# Altium footprint library AltiumLibraries.PcbLib: 247 footprints (part 8 of 16)
Each footprint in its own frame and in the unit in brackets; x right, y up, seen from the top. Pads: shape width x height; smd on the part's side, far side on the other; paste and mask are expansions set on the pad; w line width, h text height; cw(c..) or ccw(c..) is an arc to the next point about the centre after c.
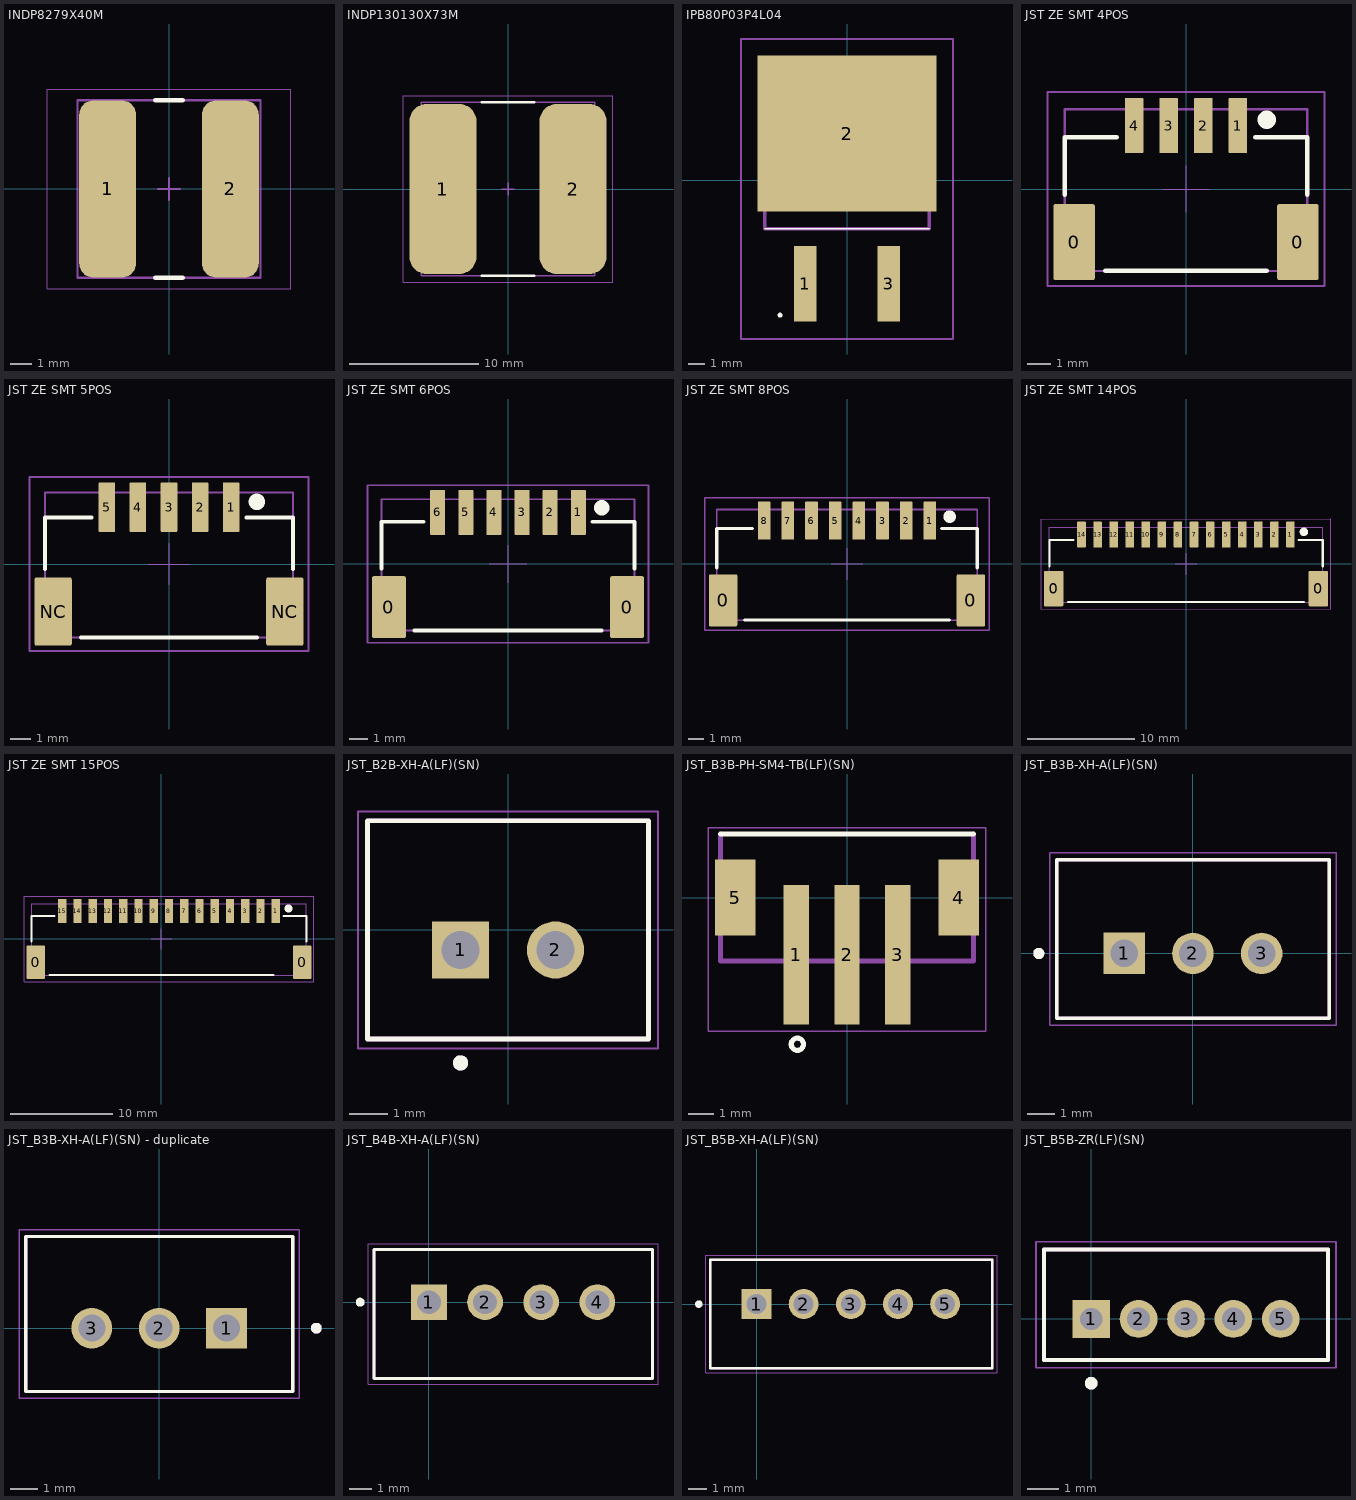
[diagram p7: the footprints below, top view; thin cyan lines are the x and y axes]

## INDP8279X40M [mm] "Precision Wire Wound Inductor, 2-Leads, Body 8.15x7.90mm, IPC Low Density"
height 4
pads (2):
  rrect50% 2.6x8.1 smd: 1(-2.8,0) 2(2.8,0)
Top Overlay:
  lines w0.2: -0.625,-4.05 0.625,-4.05 ; -0.625,4.05 0.625,4.05
Mechanical 13:
  lines w0.1: -4.175,-4.05 4.175,-4.05 4.175,4.05 -4.175,4.05 -4.175,-4.05
Mechanical 15:
  lines w0.05: -5.55,-4.55 5.55,-4.55 5.55,4.55 -5.55,4.55 -5.55,-4.55
  lines w0.1: -0.5,0 0.5,0 ; 0,-0.5 0,0.5
3D body "Inductor SRN8040.step": height 4, standoff 0, extent -4.009,-4 4.009,4

## INDP130130X73M [mm] "Precision Wire Wound Inductor, 2-Leads, Body 13.00x13.00mm, IPC Low Density"
height 7.3
pads (2):
  rrect50% 5.2x13.2 smd: 1(-5.05,0) 2(5.05,0)
Top Overlay:
  lines w0.2: -2.05,-6.75 2.05,-6.75 ; -2.05,6.75 2.05,6.75
Mechanical 13:
  lines w0.1: -6.75,-6.75 6.75,-6.75 6.75,6.75 -6.75,6.75 -6.75,-6.75
Mechanical 15:
  lines w0.05: -8.125,-7.25 8.125,-7.25 8.125,7.25 -8.125,7.25 -8.125,-7.25
  lines w0.1: -0.5,0 0.5,0 ; 0,-0.5 0,0.5
3D body "sdr1307-180ml.stp": height 7, standoff 0, extent -6.5,-6.5 6.5,6.5

## IPB80P03P4L04 [mm]
pads (3):
  rect 1.35x4.6 smd: 1(-2.54,-6.3) 3(2.54,-6.3)
  rect 10.9x9.5 smd: 2(0,2.85)
Top Overlay:
  lines w0.1: -5,-2.95 5,-2.95 -5,-2.95
  lines w0.2: -4.124,-8.198 ccw(c-4.074,-8.198) -4.024,-8.198 ccw(c-4.074,-8.198) -4.124,-8.198
Mechanical 13:
  lines w0.2: -5,-2.95 -5,6.3 5,6.3 5,-2.95 -5,-2.95
Mechanical 15:
  lines w0.1: -6.45,-9.652 -6.45,8.6 6.45,8.6 6.45,-9.652 -6.45,-9.652
3D body "TO263-2-1.stp": height 4.22, standoff 0, extent -4.911,-7.72 4.911,6.866

## JST ZE SMT 4POS [mm] "4 POS HDR JST ZE"
pads (6):
  rrect10% 1.8x3.3 smd: 0(-4.85,-2.3) 0(4.85,-2.3)
  rrect10% 0.8x2.4 smd: 1(2.25,2.75) 2(0.75,2.75) 3(-0.75,2.75) 4(-2.25,2.75)
Top Overlay:
  circle w0.8: c3.5,3 r0
  lines w0.2: -5.25,-0.25 -5.25,2.25 -3,2.25 ; -3.5,-3.55 3.5,-3.55 ; 3,2.25 5.25,2.25 5.25,-0.25
Mechanical 13:
  lines w0.1: -5.25,-3.55 -5.25,3.45 5.25,3.45 5.25,-3.55 -5.25,-3.55
Mechanical 15:
  lines w0.05: 0,-1 0,0 ; 0,1 0,0 ; 1,0 0,0 ; 0,0 -1,0 0,0
  lines w0.1: -6,-4.2 -6,4.2 6,4.2 6,-4.2 -6,-4.2

## JST ZE SMT 5POS [mm] "5 POS HDR JST ZE"
pads (7):
  rrect10% 0.8x2.4 smd: 1(3,2.75) 2(1.5,2.75) 3(0,2.75) 4(-1.5,2.75) 5(-3,2.75)
  rrect10% 1.8x3.3 smd: NC(-5.6,-2.3) NC(5.6,-2.3)
Top Overlay:
  circle w0.8: c4.25,3 r0
  lines w0.2: -6,-0.25 -6,2.25 -3.75,2.25 ; -4.25,-3.55 4.25,-3.55 ; 3.75,2.25 6,2.25 6,-0.25
Mechanical 13:
  lines w0.1: -6,-3.55 -6,3.45 6,3.45 6,-3.55 -6,-3.55
Mechanical 15:
  lines w0.05: 0,-1 0,0 ; 0,1 0,0 ; 1,0 0,0 ; 0,0 -1,0 0,0
  lines w0.1: -6.75,-4.2 -6.75,4.2 6.75,4.2 6.75,-4.2 -6.75,-4.2
3D body "BM05B-ZESS-TBT.STEP": height 7.51, standoff -0.09, extent -6,-2.9 6,4.1

## JST ZE SMT 6POS [mm] "6 POS HDR JST ZE"
pads (8):
  rrect10% 1.8x3.3 smd: 0(-6.35,-2.3) 0(6.35,-2.3)
  rrect10% 0.8x2.4 smd: 1(3.75,2.75) 2(2.25,2.75) 3(0.75,2.75) 4(-0.75,2.75) 5(-2.25,2.75) 6(-3.75,2.75)
Top Overlay:
  circle w0.8: c5,3 r0
  lines w0.2: -6.75,-0.25 -6.75,2.25 -4.5,2.25 ; -5,-3.55 5,-3.55 ; 4.5,2.25 6.75,2.25 6.75,-0.25
Mechanical 13:
  lines w0.1: -6.75,-3.55 -6.75,3.45 6.75,3.45 6.75,-3.55 -6.75,-3.55
Mechanical 15:
  lines w0.05: 0,-1 0,0 ; 0,1 0,0 ; 1,0 0,0 ; 0,0 -1,0 0,0
  lines w0.1: -7.5,-4.2 -7.5,4.2 7.5,4.2 7.5,-4.2 -7.5,-4.2

## JST ZE SMT 8POS [mm] "8 POS HDR JST ZE"
pads (10):
  rrect10% 1.8x3.3 smd: 0(-7.85,-2.3) 0(7.85,-2.3)
  rrect10% 0.8x2.4 smd: 1(5.25,2.75) 2(3.75,2.75) 3(2.25,2.75) 4(0.75,2.75) 5(-0.75,2.75) 6(-2.25,2.75) 7(-3.75,2.75) 8(-5.25,2.75)
Top Overlay:
  circle w0.8: c6.5,3 r0
  lines w0.2: -8.25,-0.25 -8.25,2.25 -6,2.25 ; -6.5,-3.55 6.5,-3.55 ; 6,2.25 8.25,2.25 8.25,-0.25
Mechanical 13:
  lines w0.1: -8.25,-3.55 8.25,-3.55 8.25,3.45 -8.25,3.45 -8.25,-3.55
Mechanical 15:
  lines w0.05: 0,-1 0,0 ; 0,1 0,0 ; 1,0 0,0 ; 0,0 -1,0 0,0
  lines w0.1: -9,-4.2 9,-4.2 9,4.2 -9,4.2 -9,-4.2

## JST ZE SMT 14POS [mm] "14 POS HDR JST ZE"
pads (16):
  rrect10% 1.8x3.3 smd: 0(-12.35,-2.3) 0(12.35,-2.3)
  rrect10% 0.8x2.4 smd: 1(9.75,2.75) 2(8.25,2.75) 3(6.75,2.75) 4(5.25,2.75) 5(3.75,2.75) 6(2.25,2.75) 7(0.75,2.75) 8(-0.75,2.75) 9(-2.25,2.75) 10(-3.75,2.75) 11(-5.25,2.75) 12(-6.75,2.75) 13(-8.25,2.75) 14(-9.75,2.75)
Top Overlay:
  circle w0.8: c11,3 r0
  lines w0.2: -12.75,-0.25 -12.75,2.25 -10.5,2.25 ; -11,-3.55 11,-3.55 ; 10.511,2.25 12.761,2.25 12.761,-0.25
Mechanical 13:
  lines w0.1: -12.75,-3.55 -12.75,3.45 12.761,3.45 12.761,-3.55 -12.75,-3.55
Mechanical 15:
  lines w0.05: 0,-1 0,0 ; 0,1 0,0 ; 1,0 0,0 ; 0,0 -1,0 0,0
  lines w0.1: -13.5,-4.2 -13.5,4.2 13.5,4.2 13.5,-4.2 -13.5,-4.2

## JST ZE SMT 15POS [mm] "15 POS HDR JST ZE"
pads (17):
  rrect10% 1.8x3.3 smd: 0(-12.35,-2.3) 0(13.85,-2.3)
  rrect10% 0.8x2.4 smd: 1(11.25,2.75) 2(9.75,2.75) 3(8.25,2.75) 4(6.75,2.75) 5(5.25,2.75) 6(3.75,2.75) 7(2.25,2.75) 8(0.75,2.75) 9(-0.75,2.75) 10(-2.25,2.75) 11(-3.75,2.75) 12(-5.25,2.75) 13(-6.75,2.75) 14(-8.25,2.75) 15(-9.75,2.75)
Top Overlay:
  circle w0.8: c12.5,3 r0
  lines w0.2: -12.75,-0.25 -12.75,2.25 -10.5,2.25 ; -11,-3.55 11,-3.55 ; 12.011,2.25 14.261,2.25 14.261,-0.25
Mechanical 13:
  lines w0.1: -12.75,-3.55 -12.75,3.45 14.261,3.45 14.261,-3.55 -12.75,-3.55
Mechanical 15:
  lines w0.05: 0,-1 0,0 ; 0,1 0,0 ; 1,0 0,0 ; 0,0 -1,0 0,0
  lines w0.1: 14.975,4.2 -13.5,4.2 -13.5,-4.2 15,-4.2 15,4.2
3D body "BM15B-ZESS-TBT.STEP": height 7.6, standoff 0, extent -12.75,-3.55 14.25,3.45

## JST_B2B-XH-A(LF)(SN) [mm]
pads (2):
  rect 1.508x1.508 hole 1: 1(-1.25,-0.525)
  round 1.508 hole 1: 2(1.25,-0.525)
Top Overlay:
  circle w0.2: c-1.25,-3.5 r0.1
  lines w0.127: -3.7,-2.875 -3.7,2.875 3.7,2.875 3.7,-2.875 -3.7,-2.875
Mechanical 13:
  circle w0.2: c-1.25,-3.5 r0.1
  lines w0.127: -3.7,-2.875 -3.7,2.875 3.7,2.875 3.7,-2.875 -3.7,-2.875
Mechanical 15:
  lines w0.05: -3.95,-3.125 -3.95,3.125 3.95,3.125 3.95,-3.125 -3.95,-3.125
3D body "B2B-XH-A(LF)(SN)--3DModel-STEP-56544.STEP": height 7.1, standoff -3.3, extent -3.7,-2.85 3.7,2.9

## JST_B3B-PH-SM4-TB(LF)(SN) [mm]
pads (5):
  rect 1x5.5 smd: 1(-2,-2.25) 2(0,-2.25) 3(2,-2.25)
  rect 1.6x3 smd: 4(4.4,0) 5(-4.4,0)
Top Overlay:
  circle w0.2: c-1.953,-5.77 r0.24
  lines w0.2: -4.975,2.5 4.975,2.5
Mechanical 13:
  lines w0.2: -4.975,2.5 -4.975,-2.5 4.975,-2.5 4.975,2.5
Mechanical 15:
  lines w0.05: -5.45,-5.25 -5.45,2.75 5.45,2.75 5.45,-5.25 -5.45,-5.25
3D body "B3B-PH-SM4-TB.STEP": height 6.61, standoff 0.01, extent -4.975,-4.5 4.975,2.5

## JST_B3B-XH-A(LF)(SN) [mm]
pads (3):
  rect 1.508x1.508 hole 1: 1(-2.5,0)
  round 1.508 hole 1: 2(0,0) 3(2.5,0)
Top Overlay:
  circle w0.2: c-5.6,0 r0.1
  lines w0.127: -4.95,-2.35 -4.95,3.4 4.95,3.4 4.95,-2.35 -4.95,-2.35
Mechanical 13:
  circle w0.2: c-5.6,0 r0.1
  lines w0.127: -4.95,-2.35 4.95,-2.35 4.95,3.4 -4.95,3.4 -4.95,-2.35
Mechanical 15:
  lines w0.05: -5.2,-2.6 5.2,-2.6 5.2,3.65 -5.2,3.65 -5.2,-2.6
3D body "B3B-XH-A-LF--SN---3DModel-STEP-269445.STEP": height 7, standoff -3.4, extent -4.961,-2.35 4.939,3.4

## JST_B3B-XH-A(LF)(SN) - duplicate [mm]
pads (3):
  rect 1.508x1.508 hole 1: 1(2.5,0)
  round 1.508 hole 1: 2(0,0) 3(-2.5,0)
Top Overlay:
  circle w0.2: c5.83,0 r0.1
  lines w0.127: -4.95,-2.35 -4.95,3.4 4.95,3.4 4.95,-2.35 -4.95,-2.35
Mechanical 13:
  circle w0.2: c5.83,0 r0.1
  lines w0.127: -4.95,-2.35 4.95,-2.35 4.95,3.4 -4.95,3.4 -4.95,-2.35
Mechanical 15:
  lines w0.05: -5.2,-2.6 5.2,-2.6 5.2,3.65 -5.2,3.65 -5.2,-2.6
3D body "step_temp.STEP": height 7, standoff -3.4, extent -4.95,-2.35 4.95,3.4

## JST_B4B-XH-A(LF)(SN) [mm]
pads (4):
  rect 1.59x1.59 hole 1.06: 1(0,0)
  round 1.59 hole 1.06: 2(2.5,0) 3(5,0) 4(7.5,0)
Top Overlay:
  circle w0.2: c-3.06,0 r0.1
  lines w0.127: -2.45,-3.4 9.95,-3.4 9.95,2.35 -2.45,2.35 -2.45,-3.4
Mechanical 13:
  lines w0.127: -2.45,-3.4 9.95,-3.4 9.95,2.35 -2.45,2.35 -2.45,-3.4
Mechanical 15:
  lines w0.05: -2.7,-3.65 10.2,-3.65 10.2,2.6 -2.7,2.6 -2.7,-3.65
3D body "B4B-XH-A-LF--SN---3DModel-STEP-56544.STEP": height 7, standoff -3.4, extent -2.45,-3.425 9.95,2.325

## JST_B5B-XH-A(LF)(SN) [mm]
pads (5):
  rect 1.59x1.59 hole 1.06: 1(0,0)
  round 1.59 hole 1.06: 2(2.5,0) 3(5,0) 4(7.5,0) 5(10,0)
Top Overlay:
  circle w0.2: c-3.06,0 r0.1
  lines w0.127: -2.45,-3.4 12.5,-3.4 12.5,2.35 -2.45,2.35 -2.45,-3.4
Mechanical 13:
  lines w0.127: -2.45,-3.4 12.5,-3.4 12.5,2.35 -2.45,2.35 -2.45,-3.4
Mechanical 15:
  lines w0.05: -2.7,-3.65 12.75,-3.65 12.75,2.6 -2.7,2.6 -2.7,-3.65

## JST_B5B-ZR(LF)(SN) [mm]
pads (5):
  rect 1.197x1.197 hole 0.7: 1(0,0)
  round 1.197 hole 0.73: 2(1.5,0) 3(3,0) 4(4.5,0) 5(6,0)
Top Overlay:
  circle w0.2: c-0.002,-2.034 r0.1
  lines w0.127: -1.5,-1.3 7.5,-1.3 7.5,2.2 -1.5,2.2 -1.5,-1.3
Mechanical 13:
  circle w0.2: c-0.002,-2.034 r0.1
  lines w0.127: -1.5,-1.3 7.5,-1.3 7.5,2.2 -1.5,2.2 -1.5,-1.3
Mechanical 15:
  lines w0.05: -1.75,-1.55 7.75,-1.55 7.75,2.45 -1.75,2.45 -1.75,-1.55
3D body "B5B-ZR -LF--SN---3DModel-STEP-56544.STEP": height 4.51, standoff -2.69, extent -1.5,-1.3 7.5,2.2